# Altium schematic symbol library 13-Logic 数字 IC.SchLib: 324 symbols (part 9 of 30) (continued)
## EPM570F100C5N (continued)
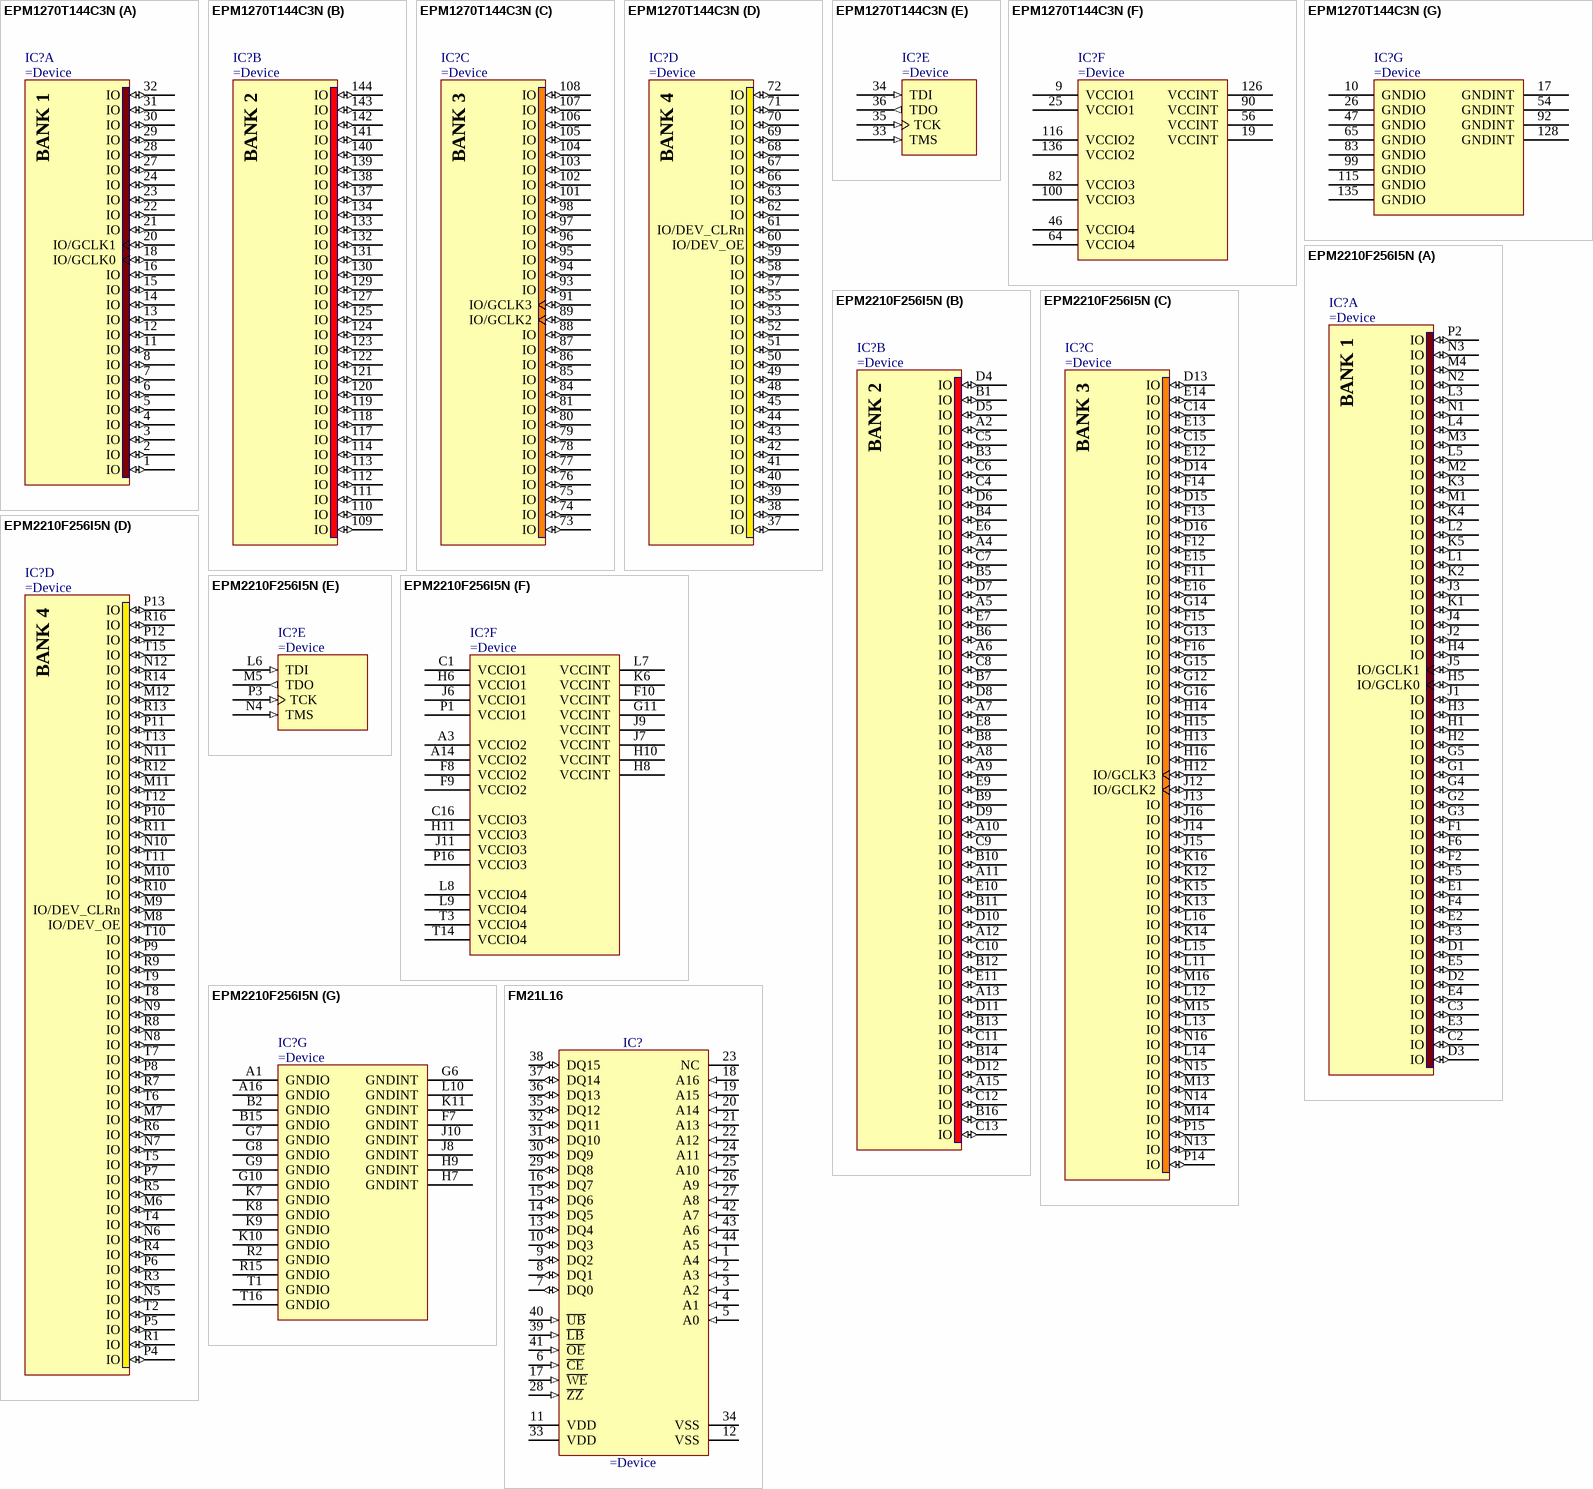
[diagram p54: symbols EPM1270T144C3N to FM21L16]
part A text: BANK 1
part B text: BANK 2

## EPM1270T144C3N
designator IC?
MAX II 3.3/2.5V CPLD, 116 IOs, 1,270 Logic Elements, 144-Pin Plastic TQFP, Commercial Temperature, Speed Grade 3, Pb-Free
part A pins: 1 IO (io), 2 IO (io), 3 IO (io), 4 IO (io), 5 IO (io), 6 IO (io), 7 IO (io), 8 IO (io), 11 IO (io), 12 IO (io), 13 IO (io), 14 IO (io), 15 IO (io), 16 IO (io), 18 IO/GCLK0 (io), 20 IO/GCLK1 (io), 21 IO (io), 22 IO (io), 23 IO (io), 24 IO (io), 27 IO (io), 28 IO (io), 29 IO (io), 30 IO (io), 31 IO (io), 32 IO (io)
part B pins: 109 IO (io), 110 IO (io), 111 IO (io), 112 IO (io), 113 IO (io), 114 IO (io), 117 IO (io), 118 IO (io), 119 IO (io), 120 IO (io), 121 IO (io), 122 IO (io), 123 IO (io), 124 IO (io), 125 IO (io), 127 IO (io), 129 IO (io), 130 IO (io), 131 IO (io), 132 IO (io), 133 IO (io), 134 IO (io), 137 IO (io), 138 IO (io), 139 IO (io), 140 IO (io), 141 IO (io), 142 IO (io), 143 IO (io), 144 IO (io)
part C pins: 73 IO (io), 74 IO (io), 75 IO (io), 76 IO (io), 77 IO (io), 78 IO (io), 79 IO (io), 80 IO (io), 81 IO (io), 84 IO (io), 85 IO (io), 86 IO (io), 87 IO (io), 88 IO (io), 89 IO/GCLK2 (io), 91 IO/GCLK3 (io), 93 IO (io), 94 IO (io), 95 IO (io), 96 IO (io), 97 IO (io), 98 IO (io), 101 IO (io), 102 IO (io), 103 IO (io), 104 IO (io), 105 IO (io), 106 IO (io), 107 IO (io), 108 IO (io)
part D pins: 37 IO (io), 38 IO (io), 39 IO (io), 40 IO (io), 41 IO (io), 42 IO (io), 43 IO (io), 44 IO (io), 45 IO (io), 48 IO (io), 49 IO (io), 50 IO (io), 51 IO (io), 52 IO (io), 53 IO (io), 55 IO (io), 57 IO (io), 58 IO (io), 59 IO (io), 60 IO/DEV_OE (io), 61 IO/DEV_CLRn (io), 62 IO (io), 63 IO (io), 66 IO (io), 67 IO (io), 68 IO (io), 69 IO (io), 70 IO (io), 71 IO (io), 72 IO (io)
part E pins: 33 TMS (in), 34 TDI (in), 35 TCK (in), 36 TDO (out)
part F pins: 9 VCCIO1 (power), 19 VCCINT (power), 25 VCCIO1 (power), 46 VCCIO4 (power), 56 VCCINT (power), 64 VCCIO4 (power), 82 VCCIO3 (power), 90 VCCINT (power), 100 VCCIO3 (power), 116 VCCIO2 (power), 126 VCCINT (power), 136 VCCIO2 (power)
part G pins: 10 GNDIO (power), 17 GNDINT (power), 26 GNDIO (power), 47 GNDIO (power), 54 GNDINT (power), 65 GNDIO (power), 83 GNDIO (power), 92 GNDINT (power), 99 GNDIO (power), 115 GNDIO (power), 128 GNDINT (power), 135 GNDIO (power)
part A text: BANK 1
part B text: BANK 2
part C text: BANK 3
part D text: BANK 4

## EPM2210F256I5N
designator IC?
MAX II 3.3/2.5V CPLD, 204 IOs, 2,210 Logic Elements, 256-Pin FineLine BGA, Industrial Temperature, Speed Grade 5, Pb-Free
part A pins: C2 IO (io), C3 IO (io), D1 IO (io), D2 IO (io), D3 IO (io), E1 IO (io), E2 IO (io), E3 IO (io), E4 IO (io), E5 IO (io), F1 IO (io), F2 IO (io), F3 IO (io), F4 IO (io), F5 IO (io), F6 IO (io), G1 IO (io), G2 IO (io), G3 IO (io), G4 IO (io), G5 IO (io), H1 IO (io), H2 IO (io), H3 IO (io), H4 IO (io), H5 IO/GCLK0 (io), J1 IO (io), J2 IO (io), J3 IO (io), J4 IO (io), J5 IO/GCLK1 (io), K1 IO (io), K2 IO (io), K3 IO (io), K4 IO (io), K5 IO (io), L1 IO (io), L2 IO (io), L3 IO (io), L4 IO (io), L5 IO (io), M1 IO (io), M2 IO (io), M3 IO (io), M4 IO (io), N1 IO (io), N2 IO (io), N3 IO (io), P2 IO (io)
part B pins: A2 IO (io), A4 IO (io), A5 IO (io), A6 IO (io), A7 IO (io), A8 IO (io), A9 IO (io), A10 IO (io), A11 IO (io), A12 IO (io), A13 IO (io), A15 IO (io), B1 IO (io), B3 IO (io), B4 IO (io), B5 IO (io), B6 IO (io), B7 IO (io), B8 IO (io), B9 IO (io), B10 IO (io), B11 IO (io), B12 IO (io), B13 IO (io), B14 IO (io), B16 IO (io), C4 IO (io), C5 IO (io), C6 IO (io), C7 IO (io), C8 IO (io), C9 IO (io), C10 IO (io), C11 IO (io), C12 IO (io), C13 IO (io), D4 IO (io), D5 IO (io), D6 IO (io), D7 IO (io), D8 IO (io), D9 IO (io), D10 IO (io), D11 IO (io), D12 IO (io), E6 IO (io), E7 IO (io), E8 IO (io), E9 IO (io), E10 IO (io), E11 IO (io)
part C pins: C14 IO (io), C15 IO (io), D13 IO (io), D14 IO (io), D15 IO (io), D16 IO (io), E12 IO (io), E13 IO (io), E14 IO (io), E15 IO (io), E16 IO (io), F11 IO (io), F12 IO (io), F13 IO (io), F14 IO (io), F15 IO (io), F16 IO (io), G12 IO (io), G13 IO (io), G14 IO (io), G15 IO (io), G16 IO (io), H12 IO/GCLK3 (io), H13 IO (io), H14 IO (io), H15 IO (io), H16 IO (io), J12 IO/GCLK2 (io), J13 IO (io), J14 IO (io), J15 IO (io), J16 IO (io), K12 IO (io), K13 IO (io), K14 IO (io), K15 IO (io), K16 IO (io), L11 IO (io), L12 IO (io), L13 IO (io), L14 IO (io), L15 IO (io), L16 IO (io), M13 IO (io), M14 IO (io), M15 IO (io), M16 IO (io), N13 IO (io), N14 IO (io), N15 IO (io), N16 IO (io), P14 IO (io), P15 IO (io)
part D pins: M6 IO (io), M7 IO (io), M8 IO/DEV_OE (io), M9 IO/DEV_CLRn (io), M10 IO (io), M11 IO (io), M12 IO (io), N5 IO (io), N6 IO (io), N7 IO (io), N8 IO (io), N9 IO (io), N10 IO (io), N11 IO (io), N12 IO (io), P4 IO (io), P5 IO (io), P6 IO (io), P7 IO (io), P8 IO (io), P9 IO (io), P10 IO (io), P11 IO (io), P12 IO (io), P13 IO (io), R1 IO (io), R3 IO (io), R4 IO (io), R5 IO (io), R6 IO (io), R7 IO (io), R8 IO (io), R9 IO (io), R10 IO (io), R11 IO (io), R12 IO (io), R13 IO (io), R14 IO (io), R16 IO (io), T2 IO (io), T4 IO (io), T5 IO (io), T6 IO (io), T7 IO (io), T8 IO (io), T9 IO (io), T10 IO (io), T11 IO (io), T12 IO (io), T13 IO (io), T15 IO (io)
part E pins: L6 TDI (in), M5 TDO (out), N4 TMS (in), P3 TCK (in)
part F pins: A3 VCCIO2 (power), A14 VCCIO2 (power), C1 VCCIO1 (power), C16 VCCIO3 (power), F8 VCCIO2 (power), F9 VCCIO2 (power), F10 VCCINT (power), G11 VCCINT (power), H6 VCCIO1 (power), H8 VCCINT (power), H10 VCCINT (power), H11 VCCIO3 (power), J6 VCCIO1 (power), J7 VCCINT (power), J9 VCCINT (power), J11 VCCIO3 (power), K6 VCCINT (power), L7 VCCINT (power), L8 VCCIO4 (power), L9 VCCIO4 (power), P1 VCCIO1 (power), P16 VCCIO3 (power), T3 VCCIO4 (power), T14 VCCIO4 (power)
part G pins: A1 GNDIO (power), A16 GNDIO (power), B2 GNDIO (power), B15 GNDIO (power), F7 GNDINT (power), G6 GNDINT (power), G7 GNDIO (power), G8 GNDIO (power), G9 GNDIO (power), G10 GNDIO (power), H7 GNDINT (power), H9 GNDINT (power), J8 GNDINT (power), J10 GNDINT (power), K7 GNDIO (power), K8 GNDIO (power), K9 GNDIO (power), K10 GNDIO (power), K11 GNDINT (power), L10 GNDINT (power), R2 GNDIO (power), R15 GNDIO (power), T1 GNDIO (power), T16 GNDIO (power)
part A text: BANK 1
part B text: BANK 2
part C text: BANK 3
part D text: BANK 4

## FM21L16
designator IC?
2.7V to 3.6V, 2Mbit (128Kx16), 60ns, Ferroelectric Nonvolatile RAM
pins: 1 A4 (in), 2 A3 (in), 3 A2 (in), 4 A1 (in), 5 A0 (in), 6 ~{CE} (in), 7 DQ0 (io), 8 DQ1 (io), 9 DQ2 (io), 10 DQ3 (io), 11 VDD (power), 12 VSS (power), 13 DQ4 (io), 14 DQ5 (io), 15 DQ6 (io), 16 DQ7 (io), 17 ~{WE} (in), 18 A16 (in), 19 A15 (in), 20 A14 (in), 21 A13 (in), 22 A12 (in), 23 NC, 24 A11 (in), 25 A10 (in), 26 A9 (in), 27 A8 (in), 28 ~{ZZ} (in), 29 DQ8 (io), 30 DQ9 (io), 31 DQ10 (io), 32 DQ11 (io), 33 VDD (power), 34 VSS (power), 35 DQ12 (io), 36 DQ13 (io), 37 DQ14 (io), 38 DQ15 (io), 39 ~{LB} (in), 40 ~{UB} (in), 41 ~{OE} (in), 42 A7 (in), 43 A6 (in), 44 A5 (in)

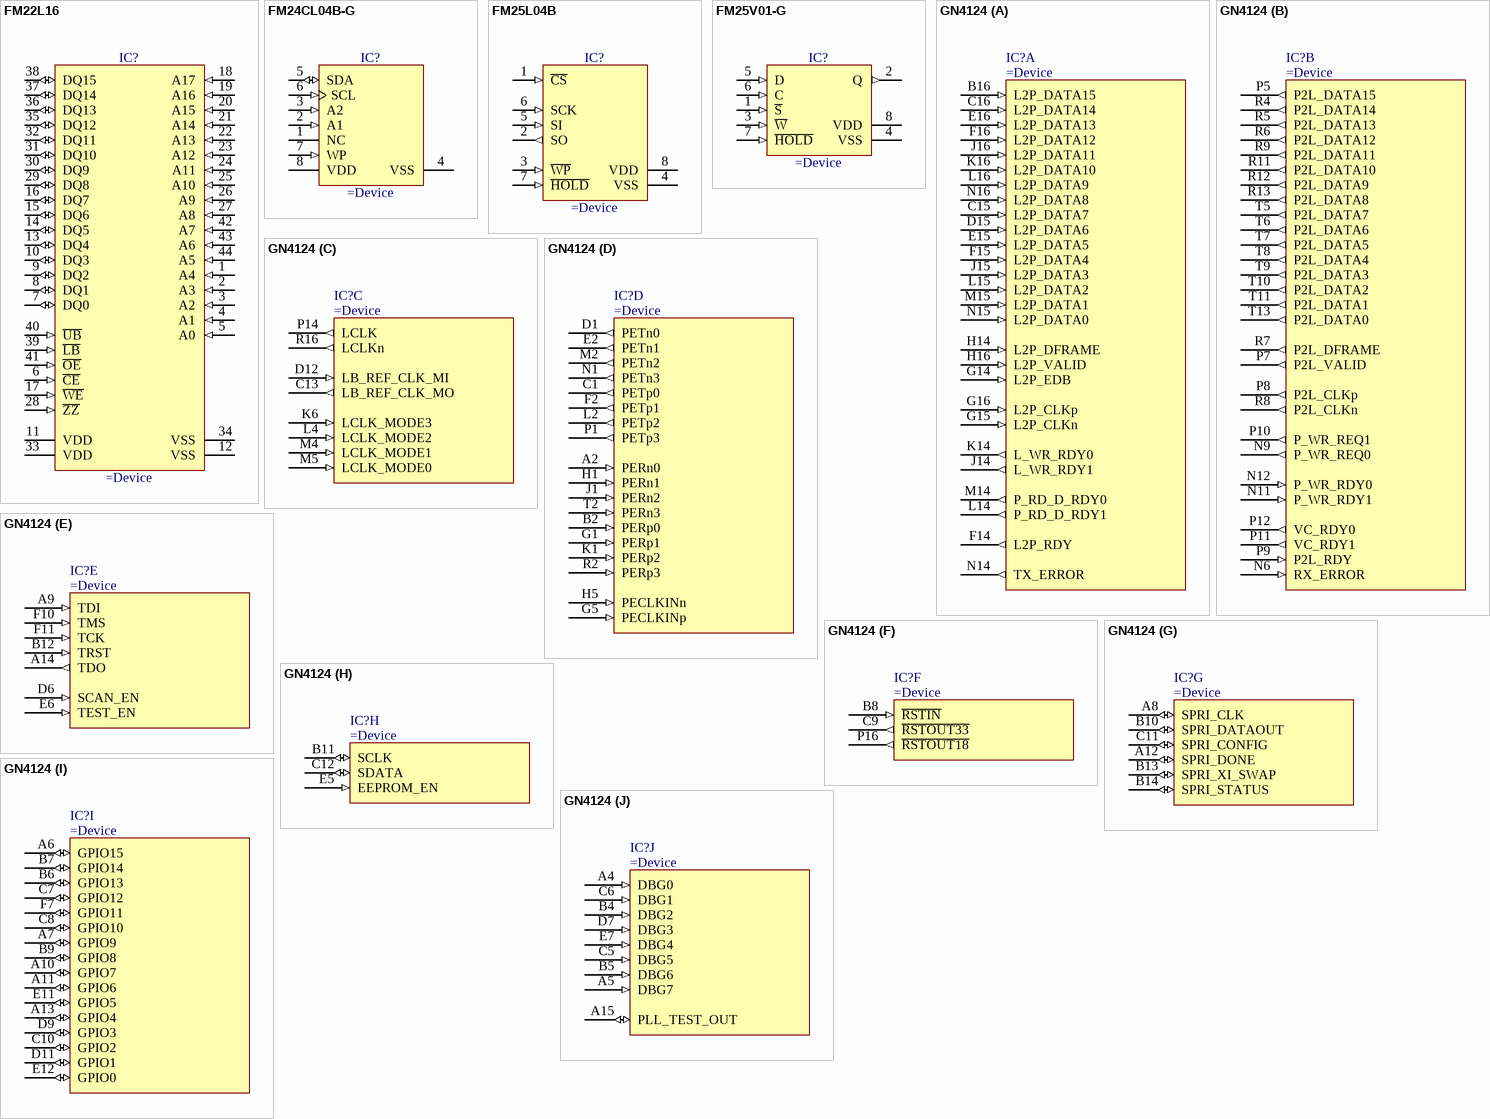
[diagram p55: symbols FM22L16 to GN4124]

## FM22L16
designator IC?
2.7V to 3.6V, 4Mbit (256Kx16), 55ns, Ferroelectric Nonvolatile RAM
pins: 1 A4 (in), 2 A3 (in), 3 A2 (in), 4 A1 (in), 5 A0 (in), 6 ~{CE} (in), 7 DQ0 (io), 8 DQ1 (io), 9 DQ2 (io), 10 DQ3 (io), 11 VDD (power), 12 VSS (power), 13 DQ4 (io), 14 DQ5 (io), 15 DQ6 (io), 16 DQ7 (io), 17 ~{WE} (in), 18 A17 (in), 19 A16 (in), 20 A15 (in), 21 A14 (in), 22 A13 (in), 23 A12 (in), 24 A11 (in), 25 A10 (in), 26 A9 (in), 27 A8 (in), 28 ~{ZZ} (in), 29 DQ8 (io), 30 DQ9 (io), 31 DQ10 (io), 32 DQ11 (io), 33 VDD (power), 34 VSS (power), 35 DQ12 (io), 36 DQ13 (io), 37 DQ14 (io), 38 DQ15 (io), 39 ~{LB} (in), 40 ~{UB} (in), 41 ~{OE} (in), 42 A7 (in), 43 A6 (in), 44 A5 (in)

## FM24CL04B-G
designator IC?
4Kb Serial 3V F-RAM Memory
pins: 1 NC, 2 A1 (in), 3 A2 (in), 4 VSS (power), 5 SDA (io), 6 SCL (in), 7 WP (in), 8 VDD (power)

## FM25L04B
designator IC?
4Kb (512 x 8 Bits) Serial 3V F-RAM Memory
pins: 1 ~{CS} (in), 2 SO (out), 3 ~{WP} (in), 4 VSS (power), 5 SI (in), 6 SCK (in), 7 ~{HOLD} (in), 8 VDD (power)

## FM25V01-G
designator IC?
128Kb Serial 3V F-RAM Memory
pins: 1 ~{S} (in), 2 Q (out), 3 ~{W} (in), 4 VSS (power), 5 D (in), 6 C (in), 7 ~{HOLD} (in), 8 VDD (power)

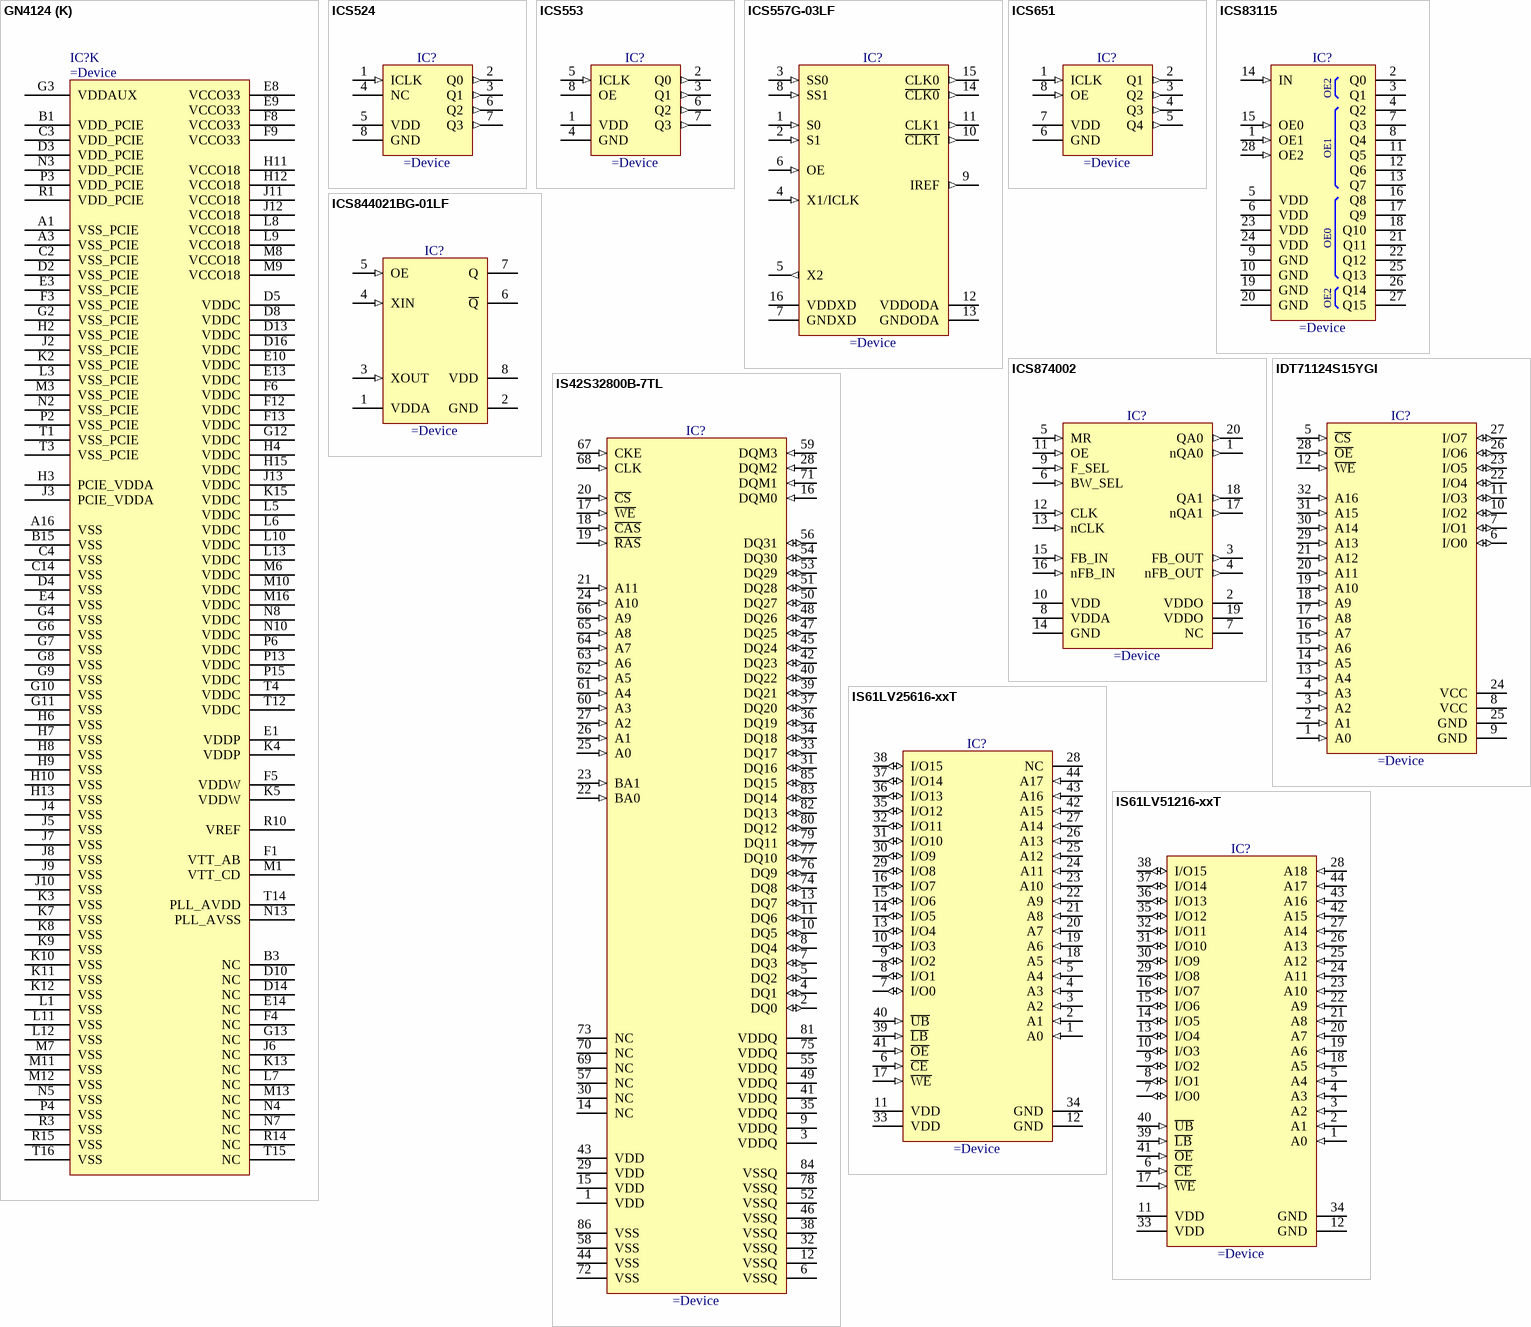
[diagram p56: symbols GN4124 to IS61LV51216-xxT]

## GN4124
designator IC?
x4 Lane PCI Express to Local Bridge
part A pins: B16 L2P_DATA15 (in), C15 L2P_DATA7 (in), C16 L2P_DATA14 (in), D15 L2P_DATA6 (in), E15 L2P_DATA5 (in), E16 L2P_DATA13 (in), F14 L2P_RDY (out), F15 L2P_DATA4 (in), F16 L2P_DATA12 (in), G14 L2P_EDB (in), G15 L2P_CLKn (in), G16 L2P_CLKp (in), H14 L2P_DFRAME (in), H16 L2P_VALID (in), J14 L_WR_RDY1 (out), J15 L2P_DATA3 (in), J16 L2P_DATA11 (in), K14 L_WR_RDY0 (out), K16 L2P_DATA10 (in), L14 P_RD_D_RDY1 (out), L15 L2P_DATA2 (in), L16 L2P_DATA9 (in), M14 P_RD_D_RDY0 (out), M15 L2P_DATA1 (in), N14 TX_ERROR (out), N15 L2P_DATA0 (in), N16 L2P_DATA8 (in)
part B pins: N6 RX_ERROR (in), N9 P_WR_REQ0 (out), N11 P_WR_RDY1 (in), N12 P_WR_RDY0 (in), P5 P2L_DATA15 (out), P7 P2L_VALID (out), P8 P2L_CLKp (out), P9 P2L_RDY (in), P10 P_WR_REQ1 (out), P11 VC_RDY1 (out), P12 VC_RDY0 (out), R4 P2L_DATA14 (out), R5 P2L_DATA13 (out), R6 P2L_DATA12 (out), R7 P2L_DFRAME (out), R8 P2L_CLKn (out), R9 P2L_DATA11 (out), R11 P2L_DATA10 (out), R12 P2L_DATA9 (out), R13 P2L_DATA8 (out), T5 P2L_DATA7 (out), T6 P2L_DATA6 (out), T7 P2L_DATA5 (out), T8 P2L_DATA4 (out), T9 P2L_DATA3 (out), T10 P2L_DATA2 (out), T11 P2L_DATA1 (out), T13 P2L_DATA0 (out)
part C pins: C13 LB_REF_CLK_MO (out), D12 LB_REF_CLK_MI (in), K6 LCLK_MODE3 (in), L4 LCLK_MODE2 (in), M4 LCLK_MODE1 (in), M5 LCLK_MODE0 (in), P14 LCLK (out), R16 LCLKn (out)
part D pins: A2 PERn0 (in), B2 PERp0 (in), C1 PETp0 (out), D1 PETn0 (out), E2 PETn1 (out), F2 PETp1 (out), G1 PERp1 (in), G5 PECLKINp (in), H1 PERn1 (in), H5 PECLKINn (in), J1 PERn2 (in), K1 PERp2 (in), L2 PETp2 (out), M2 PETn2 (out), N1 PETn3 (out), P1 PETp3 (out), R2 PERp3 (in), T2 PERn3 (in)
part E pins: A9 TDI (in), A14 TDO (out), B12 TRST (in), D6 SCAN_EN (in), E6 TEST_EN (in), F10 TMS (in), F11 TCK (in)
part F pins: B8 ~{RSTIN} (in), C9 ~{RSTOUT33} (out), P16 ~{RSTOUT18} (out)
part G pins: A8 SPRI_CLK (io), A12 SPRI_DONE (io), B10 SPRI_DATAOUT (io), B13 SPRI_XI_SWAP (io), B14 SPRI_STATUS (io), C11 SPRI_CONFIG (io)
part H pins: B11 SCLK (io), C12 SDATA (io), E5 EEPROM_EN (in)
part I pins: A6 GPIO15 (io), A7 GPIO9 (io), A10 GPIO7 (io), A11 GPIO6 (io), A13 GPIO4 (io), B6 GPIO13 (io), B7 GPIO14 (io), B9 GPIO8 (io), C7 GPIO12 (io), C8 GPIO10 (io), C10 GPIO2 (io), D9 GPIO3 (io), D11 GPIO1 (io), E11 GPIO5 (io), E12 GPIO0 (io), F7 GPIO11 (io)
part J pins: A4 DBG0 (in), A5 DBG7 (in), A15 PLL_TEST_OUT (io), B4 DBG2 (in), B5 DBG6 (in), C5 DBG5 (in), C6 DBG1 (in), D7 DBG3 (in), E7 DBG4 (in)
part K pins: A1 VSS_PCIE (power), A3 VSS_PCIE (power), A16 VSS (power), B1 VDD_PCIE (power), B3 NC, B15 VSS (power), C2 VSS_PCIE (power), C3 VDD_PCIE (power), C4 VSS (power), C14 VSS (power), D2 VSS_PCIE (power), D3 VDD_PCIE (power), D4 VSS (power), D5 VDDC (power), D8 VDDC (power), D10 NC, D13 VDDC (power), D14 NC, D16 VDDC (power), E1 VDDP (power), E3 VSS_PCIE (power), E4 VSS (power), E8 VCCO33 (power), E9 VCCO33 (power), E10 VDDC (power), E13 VDDC (power), E14 NC, F1 VTT_AB (power), F3 VSS_PCIE (power), F4 NC, F5 VDDW (power), F6 VDDC (power), F8 VCCO33 (power), F9 VCCO33 (power), F12 VDDC (power), F13 VDDC (power), G2 VSS_PCIE (power), G3 VDDAUX (power), G4 VSS (power), G6 VSS (power), G7 VSS (power), G8 VSS (power), G9 VSS (power), G10 VSS (power), G11 VSS (power), G12 VDDC (power), G13 NC, H2 VSS_PCIE (power), H3 PCIE_VDDA (power), H4 VDDC (power), H6 VSS (power), H7 VSS (power), H8 VSS (power), H9 VSS (power), H10 VSS (power), H11 VCCO18 (power), H12 VCCO18 (power), H13 VSS (power), H15 VDDC (power), J2 VSS_PCIE (power), J3 PCIE_VDDA (power), J4 VSS (power), J5 VSS (power), J6 NC, J7 VSS (power), J8 VSS (power), J9 VSS (power), J10 VSS (power), J11 VCCO18 (power), J12 VCCO18 (power), J13 VDDC (power), K2 VSS_PCIE (power), K3 VSS (power), K4 VDDP (power), K5 VDDW (power), K7 VSS (power), K8 VSS (power), K9 VSS (power), K10 VSS (power), K11 VSS (power), K12 VSS (power), K13 NC, K15 VDDC (power), L1 VSS (power), L3 VSS_PCIE (power), L5 VDDC (power), L6 VDDC (power), L7 NC, L8 VCCO18 (power), L9 VCCO18 (power), L10 VDDC (power), L11 VSS (power), L12 VSS (power), L13 VDDC (power), M1 VTT_CD (power), M3 VSS_PCIE (power), M6 VDDC (power), M7 VSS (power), M8 VCCO18 (power), M9 VCCO18 (power), M10 VDDC (power), M11 VSS (power), M12 VSS (power), M13 NC, M16 VDDC (power), N2 VSS_PCIE (power), N3 VDD_PCIE (power), N4 NC, N5 VSS (power), N7 NC, N8 VDDC (power), N10 VDDC (power), N13 PLL_AVSS (power), P2 VSS_PCIE (power), P3 VDD_PCIE (power), P4 VSS (power), P6 VDDC (power), P13 VDDC (power), P15 VDDC (power), R1 VDD_PCIE (power), R3 VSS (power), R10 VREF (power), R14 NC, R15 VSS (power), T1 VSS_PCIE (power), T3 VSS_PCIE (power), T4 VDDC (power), T12 VDDC (power), T14 PLL_AVDD (power), T15 NC, T16 VSS (power)

## ICS524
designator IC?
Low Skew 1 to 4 Clock Buffer
pins: 1 ICLK (in), 2 Q0 (out), 3 Q1 (out), 4 NC, 5 VDD (power), 6 Q2 (out), 7 Q3 (out), 8 GND (power)

## ICS553
designator IC?
Low Skew 1 to 4 Clock Buffer
pins: 1 VDD (power), 2 Q0 (out), 3 Q1 (out), 4 GND (power), 5 ICLK (in), 6 Q2 (out), 7 Q3 (out), 8 OE

## ICS557G-03LF
designator IC?
2 Output PCI-Express Gen 1 Clock Source
pins: 1 S0 (in), 2 S1 (in), 3 SS0 (in), 4 X1/ICLK (in), 5 X2 (out), 6 OE (in), 7 GNDXD (power), 8 SS1 (in), 9 IREF (out), 10 ~{CLK1} (out), 11 CLK1 (out), 12 VDDODA (power), 13 GNDODA (power), 14 ~{CLK0} (out), 15 CLK0 (out), 16 VDDXD (power)

## ICS651
designator IC?
Low Skew 1 to 4 Clock Buffer
pins: 1 ICLK (in), 2 Q1 (out), 3 Q2 (out), 4 Q3 (out), 5 Q4 (out), 6 GND (power), 7 VDD (power), 8 OE (in)

## ICS83115
designator IC?
Low Skew, 1-To-16 LVCMOS/LVTTL Fanout Buffer
pins: 1 OE1 (in), 2 Q0 (hiz), 3 Q1 (hiz), 4 Q2 (hiz), 5 VDD (power), 6 VDD (power), 7 Q3 (hiz), 8 Q4 (hiz), 9 GND (power), 10 GND (power), 11 Q5 (hiz), 12 Q6 (hiz), 13 Q7 (hiz), 14 IN (in), 15 OE0 (in), 16 Q8 (hiz), 17 Q9 (hiz), 18 Q10 (hiz), 19 GND (power), 20 GND (power), 21 Q11 (hiz), 22 Q12 (hiz), 23 VDD (power), 24 VDD (power), 25 Q13 (hiz), 26 Q14 (hiz), 27 Q15 (hiz), 28 OE2 (in)

## ICS844021BG-01LF
designator IC?
FEMTOCLOCKS Crystal-To-LVDS Ethernet Clock Generator
pins: 1 VDDA (power), 2 GND (power), 3 XOUT (in), 4 XIN (in), 5 OE (in), 6 ~{Q} (hiz), 7 Q (hiz), 8 VDD (power)

## ICS874002
designator IC?
PCI EXPRESS/Jitter Attenuator
pins: 1 nQA0 (out), 2 VDDO (power), 3 FB_OUT (out), 4 nFB_OUT (out), 5 MR (in), 6 BW_SEL (in), 7 NC, 8 VDDA (power), 9 F_SEL (in), 10 VDD (power), 11 OE (in), 12 CLK (in), 13 nCLK (in), 14 GND (power), 15 FB_IN (in), 16 nFB_IN (in), 17 nQA1 (out), 18 QA1 (out), 19 VDDO (power), 20 QA0 (out)

## IDT71124S15YGI
designator IC?
5V, 1Meg (128K x 8-Bit) CMOS Static RAM
pins: 1 A0 (in), 2 A1 (in), 3 A2 (in), 4 A3 (in), 5 ~{CS} (in), 6 I/O0 (io), 7 I/O1 (io), 8 VCC (power), 9 GND (power), 10 I/O2 (io), 11 I/O3 (io), 12 ~{WE} (in), 13 A4 (in), 14 A5 (in), 15 A6 (in), 16 A7 (in), 17 A8 (in), 18 A9 (in), 19 A10 (in), 20 A11 (in), 21 A12 (in), 22 I/O4 (io), 23 I/O5 (io), 24 VCC (power), 25 GND (power), 26 I/O6 (io), 27 I/O7 (io), 28 ~{OE} (in), 29 A13 (in), 30 A14 (in), 31 A15 (in), 32 A16 (in)

## IS42S32800B-7TL
designator IC?
3.3V, 2M Words x 32 Bits x 4 Banks (256-MBIT) Synchronous Dynamic RAM (SDRAM)
pins: 1 VDD (power), 2 DQ0 (io), 3 VDDQ (power), 4 DQ1 (io), 5 DQ2 (io), 6 VSSQ (power), 7 DQ3 (io), 8 DQ4 (io), 9 VDDQ (power), 10 DQ5 (io), 11 DQ6 (io), 12 VSSQ (power), 13 DQ7 (io), 14 NC, 15 VDD (power), 16 DQM0 (in), 17 ~{WE} (in), 18 ~{CAS} (in), 19 ~{RAS} (in), 20 ~{CS} (in), 21 A11 (in), 22 BA0 (in), 23 BA1 (in), 24 A10 (in), 25 A0 (in), 26 A1 (in), 27 A2 (in), 28 DQM2 (in), 29 VDD (power), 30 NC, 31 DQ16 (io), 32 VSSQ (power), 33 DQ17 (io), 34 DQ18 (io), 35 VDDQ (power), 36 DQ19 (io), 37 DQ20 (io), 38 VSSQ (power), 39 DQ21 (io), 40 DQ22 (io), 41 VDDQ (power), 42 DQ23 (io), 43 VDD (power), 44 VSS (power), 45 DQ24 (io), 46 VSSQ (power), 47 DQ25 (io), 48 DQ26 (io), 49 VDDQ (power), 50 DQ27 (io), 51 DQ28 (io), 52 VSSQ (power), 53 DQ29 (io), 54 DQ30 (io), 55 VDDQ (power), 56 DQ31 (io), 57 NC, 58 VSS (power), 59 DQM3 (in), 60 A3 (in), 61 A4 (in), 62 A5 (in), 63 A6 (in), 64 A7 (in), 65 A8 (in), 66 A9 (in), 67 CKE (in), 68 CLK (in), 69 NC, 70 NC, 71 DQM1 (in), 72 VSS (power), 73 NC, 74 DQ8 (io), 75 VDDQ (power), 76 DQ9 (io), 77 DQ10 (io), 78 VSSQ (power), 79 DQ11 (io), 80 DQ12 (io), 81 VDDQ (power), 82 DQ13 (io), 83 DQ14 (io), 84 VSSQ (power), 85 DQ15 (io), 86 VSS (power)

## IS61LV25616-xxT
designator IC?
256K x 16 High Speed Asynchronous CMOS Static RAM With 3.3V Supply
pins: 1 A0 (in), 2 A1 (in), 3 A2 (in), 4 A3 (in), 5 A4 (in), 6 ~{CE} (in), 7 I/O0 (io), 8 I/O1 (io), 9 I/O2 (io), 10 I/O3 (io), 11 VDD (power), 12 GND (power), 13 I/O4 (io), 14 I/O5 (io), 15 I/O6 (io), 16 I/O7 (io), 17 ~{WE} (in), 18 A5 (in), 19 A6 (in), 20 A7 (in), 21 A8 (in), 22 A9 (in), 23 A10 (in), 24 A11 (in), 25 A12 (in), 26 A13 (in), 27 A14 (in), 28 NC, 29 I/O8 (io), 30 I/O9 (io), 31 I/O10 (io), 32 I/O11 (io), 33 VDD (power), 34 GND (power), 35 I/O12 (io), 36 I/O13 (io), 37 I/O14 (io), 38 I/O15 (io), 39 ~{LB} (in), 40 ~{UB} (in), 41 ~{OE} (in), 42 A15 (in), 43 A16 (in), 44 A17 (in)

## IS61LV51216-xxT
designator IC?
512K x 16 High Speed Asynchronous CMOS Static RAM With 3.3V Supply
pins: 1 A0 (in), 2 A1 (in), 3 A2 (in), 4 A3 (in), 5 A4 (in), 6 ~{CE} (in), 7 I/O0 (io), 8 I/O1 (io), 9 I/O2 (io), 10 I/O3 (io), 11 VDD (power), 12 GND (power), 13 I/O4 (io), 14 I/O5 (io), 15 I/O6 (io), 16 I/O7 (io), 17 ~{WE} (in), 18 A5 (in), 19 A6 (in), 20 A7 (in), 21 A8 (in), 22 A9 (in), 23 A10 (in), 24 A11 (in), 25 A12 (in), 26 A13 (in), 27 A14 (in), 28 A18 (in), 29 I/O8 (io), 30 I/O9 (io), 31 I/O10 (io), 32 I/O11 (io), 33 VDD (power), 34 GND (power), 35 I/O12 (io), 36 I/O13 (io), 37 I/O14 (io), 38 I/O15 (io), 39 ~{LB} (in), 40 ~{UB} (in), 41 ~{OE} (in), 42 A15 (in), 43 A16 (in), 44 A17 (in)

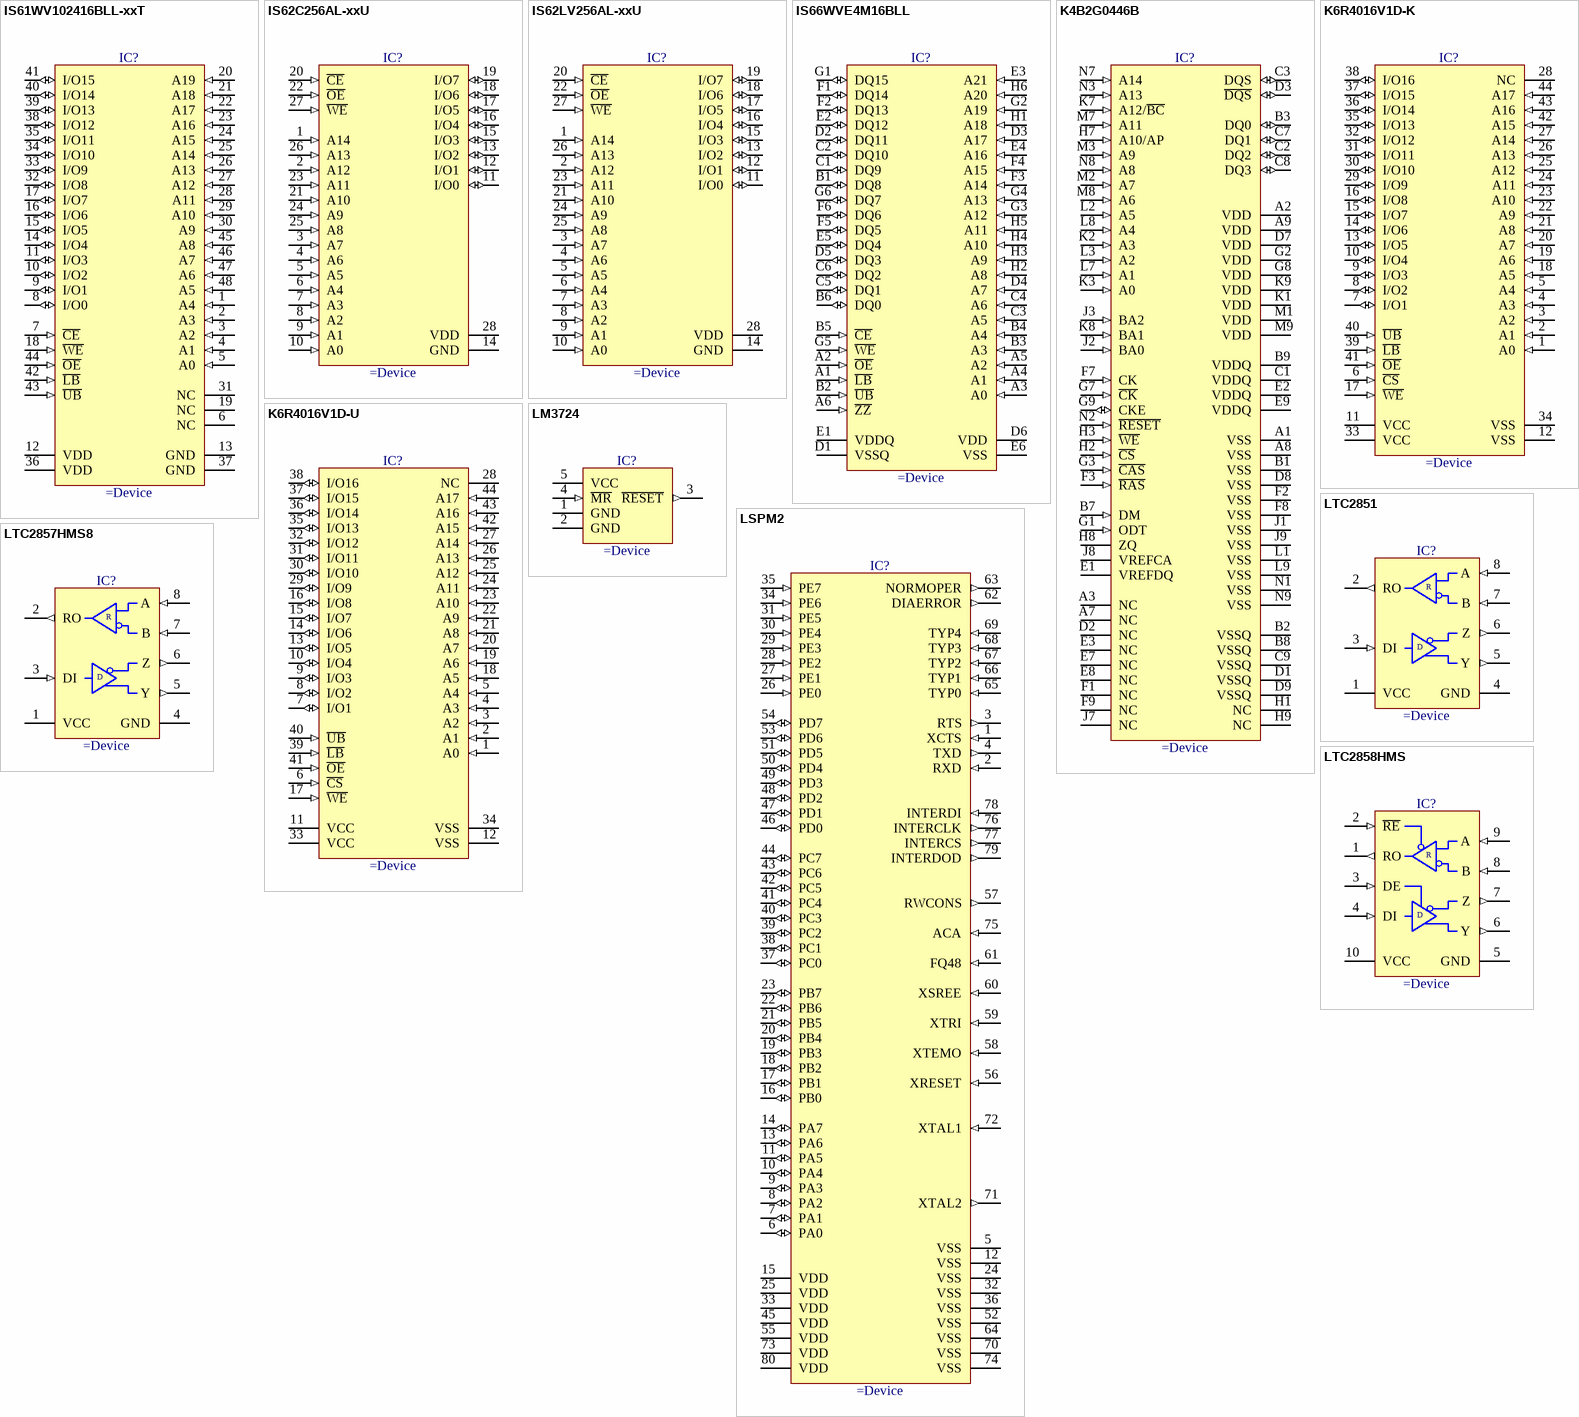
[diagram p57: symbols IS61WV102416BLL-xxT to LTC2858HMS]

## IS61WV102416BLL-xxT
designator IC?
1M x 16 High Speed Asynchronous CMOS Static RAM With 3.3V Supply
pins: 1 A4 (in), 2 A3 (in), 3 A2 (in), 4 A1 (in), 5 A0 (in), 6 NC, 7 ~{CE} (in), 8 I/O0 (io), 9 I/O1 (io), 10 I/O2 (io), 11 I/O3 (io), 12 VDD (power), 13 GND (power), 14 I/O4 (io), 15 I/O5 (io), 16 I/O6 (io), 17 I/O7 (io), 18 ~{WE} (in), 19 NC, 20 A19 (in), 21 A18 (in), 22 A17 (in), 23 A16 (in), 24 A15 (in), 25 A14 (in), 26 A13 (in), 27 A12 (in), 28 A11 (in), 29 A10 (in), 30 A9 (in), 31 NC, 32 I/O8 (io), 33 I/O9 (io), 34 I/O10 (io), 35 I/O11 (io), 36 VDD (power), 37 GND (power), 38 I/O12 (io), 39 I/O13 (io), 40 I/O14 (io), 41 I/O15 (io), 42 ~{LB} (in), 43 ~{UB} (in), 44 ~{OE} (in), 45 A8 (in), 46 A7 (in), 47 A6 (in), 48 A5 (in)

## IS62C256AL-xxU
designator IC?
32K x 8 Low Power CMOS Static RAM
pins: 1 A14 (in), 2 A12 (in), 3 A7 (in), 4 A6 (in), 5 A5 (in), 6 A4 (in), 7 A3 (in), 8 A2 (in), 9 A1 (in), 10 A0 (in), 11 I/O0 (io), 12 I/O1 (io), 13 I/O2 (io), 14 GND (power), 15 I/O3 (io), 16 I/O4 (io), 17 I/O5 (io), 18 I/O6 (io), 19 I/O7 (io), 20 ~{CE} (in), 21 A10 (in), 22 ~{OE} (in), 23 A11 (in), 24 A9 (in), 25 A8 (in), 26 A13 (in), 27 ~{WE} (in), 28 VDD (power)

## IS62LV256AL-xxU
designator IC?
3.3V 32K x 8 CMOS Static RAM
pins: 1 A14 (in), 2 A12 (in), 3 A7 (in), 4 A6 (in), 5 A5 (in), 6 A4 (in), 7 A3 (in), 8 A2 (in), 9 A1 (in), 10 A0 (in), 11 I/O0 (io), 12 I/O1 (io), 13 I/O2 (io), 14 GND (power), 15 I/O3 (io), 16 I/O4 (io), 17 I/O5 (io), 18 I/O6 (io), 19 I/O7 (io), 20 ~{CE} (in), 21 A10 (in), 22 ~{OE} (in), 23 A11 (in), 24 A9 (in), 25 A8 (in), 26 A13 (in), 27 ~{WE} (in), 28 VDD (power)

## IS66WVE4M16BLL
designator IC?
3.0V, 4M x 16 (64 Mb) Core Async/Page PSRAM
pins: A1 ~{LB} (in), A2 ~{OE} (in), A3 A0 (in), A4 A1 (in), A5 A2 (in), A6 ~{ZZ} (in), B1 DQ8 (io), B2 ~{UB} (in), B3 A3 (in), B4 A4 (in), B5 ~{CE} (in), B6 DQ0 (io), C1 DQ9 (io), C2 DQ10 (io), C3 A5 (in), C4 A6 (in), C5 DQ1 (io), C6 DQ2 (io), D1 VSSQ (power), D2 DQ11 (io), D3 A17 (in), D4 A7 (in), D5 DQ3 (io), D6 VDD (power), E1 VDDQ (power), E2 DQ12 (io), E3 A21 (in), E4 A16 (in), E5 DQ4 (io), E6 VSS (power), F1 DQ14 (io), F2 DQ13 (io), F3 A14 (in), F4 A15 (in), F5 DQ5 (io), F6 DQ6 (io), G1 DQ15 (io), G2 A19 (in), G3 A12 (in), G4 A13 (in), G5 ~{WE} (in), G6 DQ7 (io), H1 A18 (in), H2 A8 (in), H3 A9 (in), H4 A10 (in), H5 A11 (in), H6 A20 (in)

## K4B2G0446B
designator IC?
2Gb B-die DDR3 SDRAM Specification
pins: A1 VSS (power), A2 VDD (power), A3 NC, A7 NC, A8 VSS (power), A9 VDD (power), B1 VSS (power), B2 VSSQ (power), B3 DQ0 (io), B7 DM (in), B8 VSSQ (power), B9 VDDQ (power), C1 VDDQ (power), C2 DQ2 (io), C3 DQS (io), C7 DQ1 (io), C8 DQ3 (io), C9 VSSQ (power), D1 VSSQ (power), D2 NC, D3 ~{DQS} (io), D7 VDD (power), D8 VSS (power), D9 VSSQ (power), E1 VREFDQ (power), E2 VDDQ (power), E3 NC, E7 NC, E8 NC, E9 VDDQ (power), F1 NC, F2 VSS (power), F3 ~{RAS} (in), F7 CK (in), F8 VSS (power), F9 NC, G1 ODT (in), G2 VDD (power), G3 ~{CAS} (in), G7 ~{CK} (in), G8 VDD (power), G9 CKE (io), H1 NC, H2 ~{CS} (in), H3 ~{WE} (in), H7 A10/AP (in), H8 ZQ (power), H9 NC (power), J1 VSS, J2 BA0 (in), J3 BA2 (in), J7 NC, J8 VREFCA (power), J9 VSS (power), K1 VDD (power), K2 A3 (in), K3 A0 (in), K7 A12/~{BC} (in), K8 BA1 (in), K9 VDD (power), L1 VSS (power), L2 A5 (in), L3 A2 (in), L7 A1 (in), L8 A4 (in), L9 VSS (power), M1 VDD (power), M2 A7 (in), M3 A9 (in), M7 A11 (in), M8 A6 (in), M9 VDD (power), N1 VSS (power), N2 ~{RESET} (in), N3 A13 (in), N7 A14 (in), N8 A8 (in), N9 VSS (power)